# Altium footprint library lib_datalogger.PcbLib: 866 footprints (part 35 of 55)
Each footprint in its own frame and in the unit in brackets; x right, y up, seen from the top. Pads: shape width x height; smd on the part's side, far side on the other; paste and mask are expansions set on the pad; w line width, h text height; cw(c..) or ccw(c..) is an arc to the next point about the centre after c.
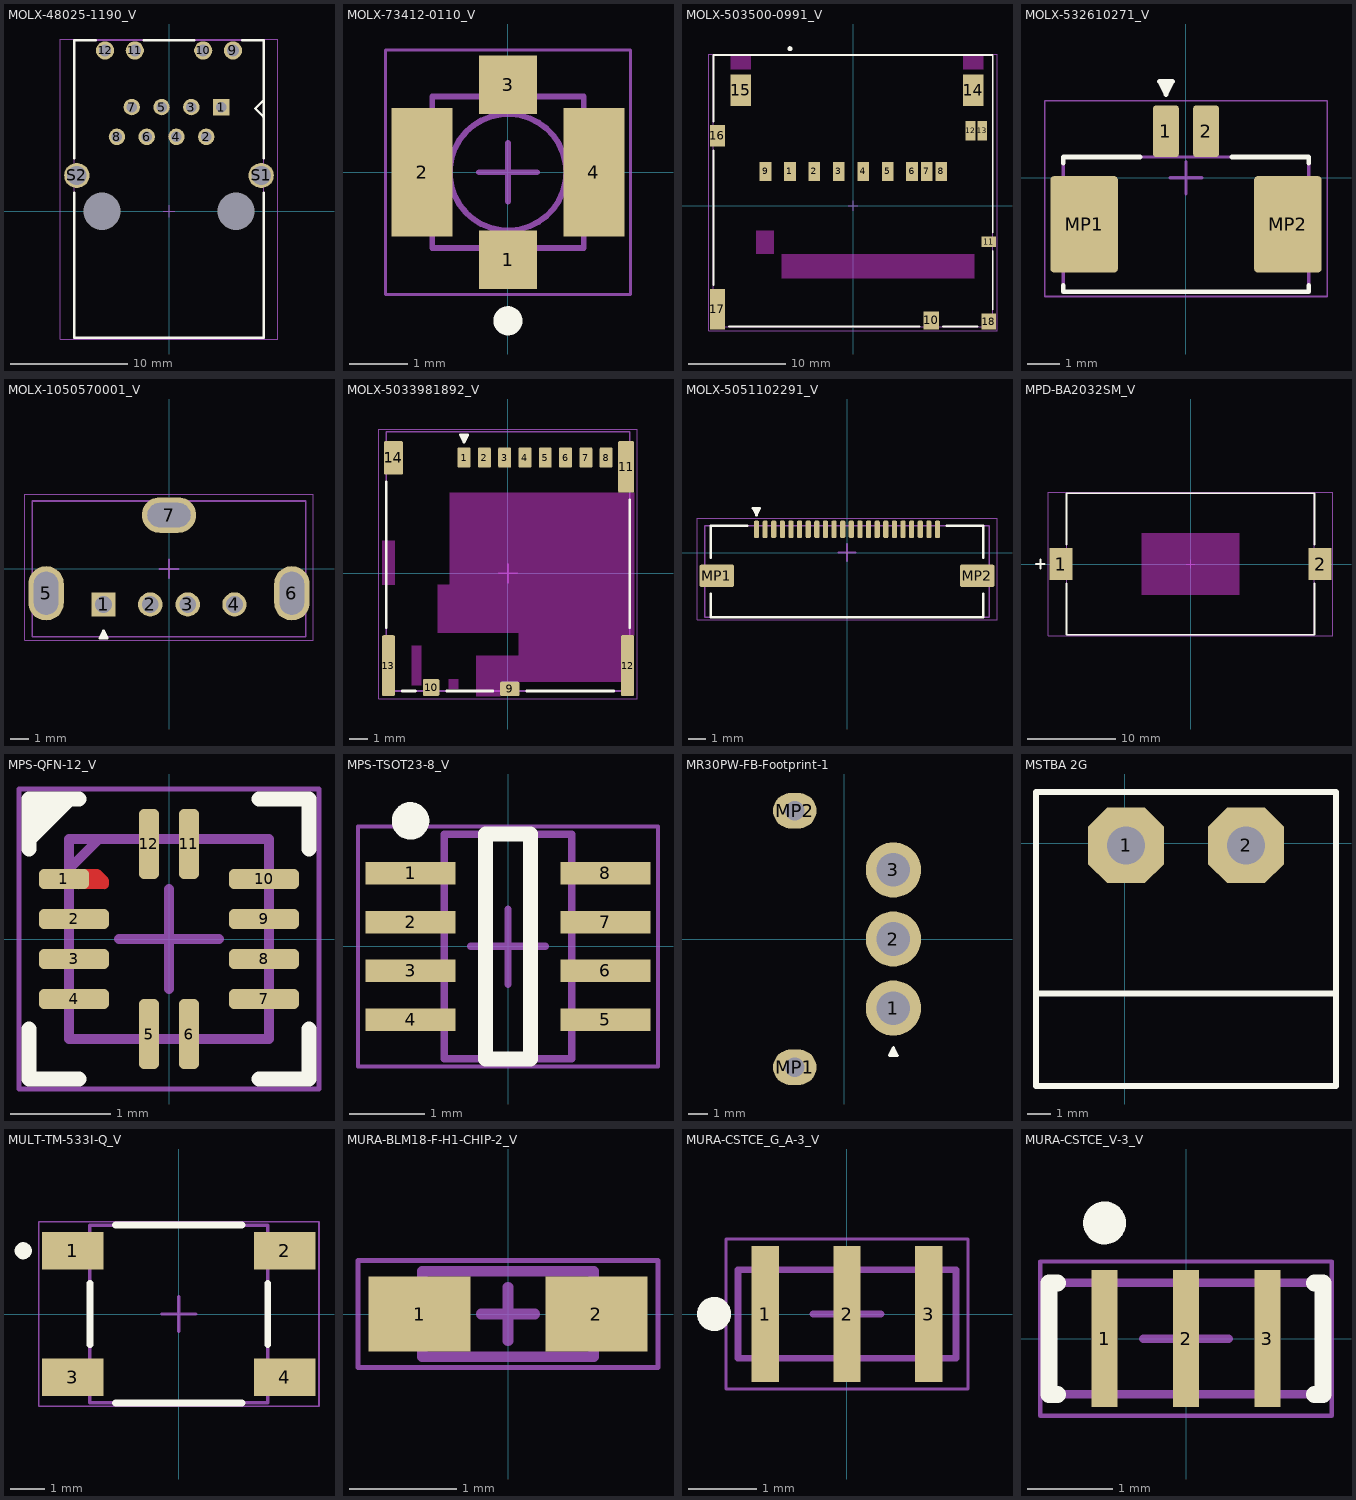
[diagram p34: the footprints below, top view; thin cyan lines are the x and y axes]

## MOLX-48025-1190_V [mm] "Connector, 12-Leads, Body 16.2x25.4mm"
height 14.36
pads (16):
  rect 1.4x1.4 hole 0.89: 1(4.445,8.89)
  round 1.4 hole 0.89: 2(3.175,6.35) 3(1.905,8.89) 4(0.635,6.35) 5(-0.635,8.89) 6(-1.905,6.35) 7(-3.175,8.89) 8(-4.445,6.35)
  round 1.55 hole 1.02: 9(5.46,13.72) 10(2.92,13.72) 11(-2.92,13.72) 12(-5.46,13.72)
  round 0 hole 3.18 unplated: MH1(5.715,0) MH2(-5.715,0)
  round 2.15 hole 1.63: S1(7.87,3.05) S2(-7.87,3.05)
Top Overlay:
  lines w0.2: -8.1,1.593 -8.1,-10.805 8.1,-10.805 8.1,1.593 ; -8.1,4.507 -8.1,14.6 -6.239,14.6 ; -2.141,14.6 2.141,14.6 ; 6.239,14.6 8.1,14.6 8.1,4.507 ; 8.05,8.079 7.366,8.763 8.05,9.447
Mechanical 13:
  lines w0.1: 8.05,8.079 7.366,8.763 8.05,9.447 ; -8.1,-10.805 -8.1,14.6 8.1,14.6 8.1,-10.805 -8.1,-10.805
Mechanical 15:
  lines w0.05: -9.263,-10.905 9.263,-10.905 9.263,14.7 -9.263,14.7 -9.263,-10.905
  lines w0.1: -0.5,0 0.5,0 ; 0,-0.5 0,0.5
3D body "480251190.stp": height 14.35, standoff -3.8, extent -9.163,-10.795 9.163,14.605

## MOLX-73412-0110_V [mm] "MCRF, 4-Leads, Body 2.6x2.6mm"
height 1.3
pads (4):
  rect 1x1 smd: 1(0,-1.5) 3(0,1.5)
  rect 1.05x2.2 smd: 2(-1.475,0) 4(1.475,0)
Top Overlay:
  circle w0.25: c0,-2.55 r0.125
Mechanical 13:
  circle w0.1: c0,0 r1
  lines w0.1: -1.299,-1.299 1.3,-1.299 1.3,1.3 -1.299,1.3 -1.299,-1.299
Mechanical 15:
  lines w0.05: -2.1,-2.1 -2.1,2.1 2.1,2.1 2.1,-2.1 -2.1,-2.1
  lines w0.1: -0.5,0 0.5,0 ; 0,-0.5 0,0.5
3D body: height 0.35, standoff 0, extent -1.299,-1.299 1.3,1.3
3D body: height 1.3, standoff 0.1, extent -1.124,-1.139 1.104,1.09
3D body: height 1.3, standoff 0.1, extent -1.126,-1.141 1.102,1.088
3D body: height 1, standoff 0.1, extent -0.254,-0.254 0.254,0.254

## MOLX-503500-0991_V [mm] "SD Card, 9-Leads, Body 28.6x27.8mm"
height 3.1
pads (18):
  rect 1.2x1.95 smd: 1(-6.457,3.533) 2(-3.957,3.533) 3(-1.457,3.533) 4(1.043,3.533) 5(3.543,3.533) 6(6.043,3.533) 7(7.543,3.533) 8(9.043,3.533) 9(-8.957,3.533)
  rect 1.6x1.87 smd: 10(8.017,-11.727)
  rect 1.5x1.1 smd: 11(13.888,-3.672)
  rect 1x2 smd: 12(12.038,7.698) 13(13.237,7.698)
  rect 2.1x3.2 smd: 14(12.318,11.838) 15(-11.482,11.838)
  rect 1.55x2.2 smd: 16(-13.887,7.158)
  rect 1.55x4.17 smd: 17(-13.887,-10.577)
  rect 1.5x1.65 smd: 18(13.888,-11.837)
Top Layer keep-out:
  rectangle: -7.312,-7.442 12.428,-4.942
  rectangle: -9.907,-4.942 -8.102,-2.542
  rectangle: 11.268,13.938 13.368,15.488
  rectangle: -12.532,13.938 -10.432,15.488
Top Overlay:
  circle w0.25: c-6.457,16.09 r0.127
  lines w0.2: -14.3,-8.092 -14.3,5.658 ; -14.3,8.658 -14.3,15.438 14.3,15.438 14.3,-2.722 ; -12.712,-12.362 6.818,-12.362 ; 9.217,-12.362 12.738,-12.362 ; 14.3,-10.612 14.3,-4.622
Mechanical 13:
  lines w0.1: -14.3,-12.362 -14.3,15.438 14.3,15.438 14.3,-12.362 -14.3,-12.362
Mechanical 15:
  lines w0.05: -14.762,-12.762 14.737,-12.762 14.737,15.538 -14.762,15.538 -14.762,-12.762
  lines w0.1: -0.5,0 0.5,0 ; 0,-0.5 0,0.5
3D body "5035000991.stp": height 2.95, standoff 0, extent -14.3,-12.363 14.3,15.438

## MOLX-532610271_V [mm] "SMD, 2-Leads, Body 7.65x4.2mm, Pitch 1.25mm"
height 3.6
pads (4):
  rrect20% 0.8x1.6 smd: 1(-0.625,1.45) 2(0.625,1.45)
  rrect10% 2.1x3 smd: MP1(-3.175,-1.45) MP2(3.175,-1.45)
Top Overlay:
  region: -0.425,3 -0.825,3 -0.625,2.6
  lines w0.15: -3.825,-3.35 -3.825,-3.55 3.825,-3.55 3.825,-3.35 ; -3.825,0.45 -3.825,0.65 -1.425,0.65 ; 1.425,0.65 3.825,0.65 3.825,0.45 ; -0.825,3 -0.625,2.6 -0.425,3 -0.825,3
Mechanical 13:
  lines w0.1: -3.825,-3.55 3.825,-3.55 3.825,0.65 -3.825,0.65 -3.825,-3.55
Mechanical 15:
  lines w0.05: -4.4,-3.7 4.4,-3.7 4.4,2.4 -4.4,2.4 -4.4,-3.7
  lines w0.1: -0.5,0 0.5,0 ; 0,-0.5 0,0.5
Top Designator:
  text ".Designator" at -1.27,-1.27 h0.6
3D body "532610271.stp": height 3.4, standoff 0, extent -3.825,-3.55 3.825,1.65

## MOLX-1050570001_V [mm] "THD, 4-Leads, Body 14.63x7.25mm"
height 10.5
pads (7):
  rrect10% 1.3x1.3 hole 0.9: 1(-3.5,-1.9)
  round 1.3 hole 0.9: 2(-1,-1.9) 3(1,-1.9) 4(3.5,-1.9)
  oval 1.9x2.9 hole 1.3 slot 2.3 at 90 deg: 5(-6.57,-1.3) 6(6.57,-1.3)
  oval 2.9x1.9 hole 1.3 slot 2.3 at 0 deg: 7(0,2.88)
Top Overlay:
  region: -3.3,-3.7 -3.7,-3.7 -3.5,-3.3
  lines w0.15: -3.7,-3.7 -3.5,-3.3 -3.3,-3.7 -3.7,-3.7
Mechanical 13:
  lines w0.1: -7.315,-3.625 7.315,-3.625 7.315,3.625 -7.315,3.625 -7.315,-3.625
Mechanical 15:
  lines w0.05: -7.7,-3.8 -7.7,4 7.7,4 7.7,-3.8 -7.7,-3.8
  lines w0.1: -0.5,0 0.5,0 ; 0,-0.5 0,0.5
Top Designator:
  text ".Designator" at -1.27,0.889 h0.6
3D body "1050570001.stp": height 10.5, standoff -3.8, extent -7.359,-3.625 7.315,3.659

## MOLX-5033981892_V [mm] "CONN, 8-Leads, Body 14.05x13.2mm, Pitch 1.1mm"
height 1.4
pads (14):
  rrect20% 0.7x1.1 smd: 1(-2.38,6.27) 2(-1.28,6.27) 3(-0.18,6.27) 4(0.92,6.27) 5(2.02,6.27) 6(3.12,6.27) 7(4.22,6.27) 8(5.32,6.27)
  rrect20% 1.05x0.78 smd: 9(0.095,-6.27)
  rrect20% 0.9x0.93 smd: 10(-4.17,-6.195)
  rrect20% 0.86x2.8 smd: 11(6.4,5.77)
  rrect20% 0.7x3.3 smd: 12(6.48,-5.01)
  rrect25% 0.7x3.3 smd: 13(-6.48,-5.01)
  rrect20% 1.04x1.83 smd: 14(-6.21,6.255)
Top Layer keep-out:
  rectangle: -3.22,-6.28 -2.67,-5.73
  rectangle: -5.235,-6.08 -4.685,-3.93
  rectangle: -6.83,-0.63 -6.13,1.77
  region: 6.83,4.37 6.83,-3.36 6.13,-3.36 6.13,-5.88 -0.43,-5.88 -0.43,-6.66 -1.73,-6.66 -1.73,-4.48 0.57,-4.48 0.57,-3.23 -3.82,-3.23 -3.82,-0.63 -3.17,-0.63 -3.17,4.37
Top Overlay:
  region: -2.18,7.5 -2.58,7.5 -2.38,7.1
  lines w0.15: -6.6,-2.96 -6.6,4.94 ; -5.73,-6.38 -5.02,-6.38 ; -3.32,-6.38 -0.83,-6.38 ; 1.02,-6.38 5.73,-6.38 ; 6.6,-2.96 6.6,3.97 ; -2.58,7.5 -2.38,7.1 -2.18,7.5 -2.58,7.5
Mechanical 13:
  lines w0.1: -6.6,-6.38 6.6,-6.38 6.6,7.67 -6.6,7.67 -6.6,-6.38
Mechanical 15:
  lines w0.05: -7,-6.8 -7,7.8 7,7.8 7,-6.8 -7,-6.8
  lines w0.1: -0.5,0 0.5,0 ; 0,-0.5 0,0.5
Top Designator:
  text ".Designator" at -4.318,1.27 h0.6
3D body "5033981892.stp": height 1.28, standoff 0, extent -6.55,-6.38 6.55,7.67

## MOLX-5051102291_V [mm] "SMD, 22-Leads, Body 5.3x16.5mm, Pitch 0.5mm"
height 4.26
pads (24):
  rrect50% 0.3x1 smd: 1(-5.25,1.35) 2(-4.75,1.35) 3(-4.25,1.35) 4(-3.75,1.35) 5(-3.25,1.35) 6(-2.75,1.35) 7(-2.25,1.35) 8(-1.75,1.35) 9(-1.25,1.35) 10(-0.75,1.35) 11(-0.25,1.35) 12(0.25,1.35) 13(0.75,1.35) 14(1.25,1.35) 15(1.75,1.35) 16(2.25,1.35) 17(2.75,1.35) 18(3.25,1.35) 19(3.75,1.35) 20(4.25,1.35) 21(4.75,1.35) 22(5.25,1.35)
  rrect15% 2x1.3 smd: MP1(-7.55,-1.35) MP2(7.55,-1.35)
Top Overlay:
  region: -5.05,2.575 -5.45,2.575 -5.25,2.175
  lines w0.15: -7.9,-2.4 -7.9,-3.75 7.9,-3.75 7.9,-2.4 ; -7.9,-0.3 -7.9,1.55 -5.8,1.55 ; 5.8,1.55 7.9,1.55 7.9,-0.3 ; -5.45,2.575 -5.25,2.175 -5.05,2.575 -5.45,2.575
Mechanical 13:
  lines w0.1: -8.25,-3.75 -8.25,1.55 8.25,1.55 8.25,-3.75 -8.25,-3.75
Mechanical 15:
  lines w0.05: -8.7,-3.9 -8.7,2 8.7,2 8.7,-3.9 -8.7,-3.9
  lines w0.1: -0.5,0 0.5,0 ; 0,-0.5 0,0.5
Top Designator:
  text ".Designator" at -1.397,-1.397 h0.6
3D body "5051102291.stp": height 1.9, standoff 0, extent -8.25,-3.75 8.25,1.55

## MPD-BA2032SM_V [mm] "Coin Cell Holder, 2-Leads, Body 28x16mm"
height 6.7
pads (2):
  rect 2.6x3.56 smd: 1(-14.65,0) 2(14.65,0)
Top Overlay:
  lines w0.2: -17.45,0 -16.45,0 ; -16.95,-0.5 -16.95,0.5 ; -14,-2.18 -14,-8 14,-8 14,-2.18 ; -14,2.18 -14,8 14,8 14,2.18
Keep-Out Layer:
  region: -5.5,-3.5 5.5,-3.5 5.5,3.5 -5.5,3.5
Mechanical 13:
  lines w0.1: -14,-8 -14,8 14,8 ; -13.97,-8.001 13.999,-8.001 ; 13.999,8 13.999,-8.001 ; 14,-8 13.999,-8.001
Mechanical 15:
  lines w0.05: -16.05,-8.1 -16.05,8.1 16.05,8.1 16.05,-8.1 -16.05,-8.1
  lines w0.1: -0.5,0 0.5,0 ; 0,-0.5 0,0.5
3D body: height 6.7, standoff 6, extent -11.43,-8.001 -5.207,-3.81
3D body: height 6.7, standoff 6, extent -11.43,3.809 -5.207,8
3D body: height 6.7, standoff 0, extent -14,-8.001 -11.43,8
3D body: height 6.7, standoff 6, extent -7.849,-1.499 -4.851,1.499
3D body: height 6.7, standoff 6, extent -11.43,-1.193 -7.206,1.22
3D body: height 6.7, standoff 0, extent 12.699,-8.001 13.999,8
3D body: height 6.7, standoff 6, extent 10.16,-8.001 12.701,-4.447
3D body: height 6.7, standoff 6, extent 11.176,-3.175 12.7,2.54
3D body: height 1, standoff 0, extent -11.43,-8.001 12.701,8
3D body: height 2.5, standoff 0, extent -11.43,6.35 12.7,8
3D body: height 2.5, standoff 0, extent -11.429,-8.001 12.701,-6.351
3D body: height 2.5, standoff 0, extent -3.175,-3.428 6.35,-2.539
3D body: height 2.5, standoff 0, extent -3.175,2.033 6.35,2.922
3D body: height 6.7, standoff 6, extent 10.16,4.445 12.7,7.999

## MPS-QFN-12_V [mm] "QFN, 12-Leads, Body 2x2mm, Pitch 0.4mm"
height 1
pads (12):
  rrect50% 0.5x0.2 smd: 1(-1.05,0.6)
  rrect50% 0.7x0.2 smd: 2(-0.95,0.2) 3(-0.95,-0.2) 4(-0.95,-0.6) 7(0.95,-0.6) 8(0.95,-0.2) 9(0.95,0.2) 10(0.95,0.6)
  rrect50% 0.2x0.7 smd: 5(-0.2,-0.95) 6(0.2,-0.95) 11(0.2,0.95) 12(-0.2,0.95)
Top Layer:
  region: -0.9,0.5 -0.65,0.5 -0.64,0.5 -0.622,0.508 -0.608,0.522 -0.6,0.54 -0.6,0.55 -0.6,0.575 -0.6,0.581 -0.602,0.593 -0.607,0.604 -0.613,0.613 -0.618,0.618 -0.682,0.682 -0.687,0.687 -0.696,0.693 -0.707,0.698 -0.719,0.7 -0.725,0.7 -0.9,0.7
Top Overlay:
  region: -1.4,1.4 -1.4,1 -1,1.4
  lines w0.15: -1.4,-0.9 -1.4,-1.4 -0.9,-1.4 ; -1.4,0.9 -1.4,1 ; -0.9,1.4 -1,1.4 ; 0.9,-1.4 1.4,-1.4 1.4,-0.9 ; 0.9,1.4 1.4,1.4 1.4,0.9 ; -1.4,1 -1.4,1.4 -1,1.4 ; -1.4,1 -1,1.4
Mechanical 13:
  lines w0.1: -1,0.7 -0.7,1 ; -1,-1 1,-1 1,1 -1,1 -1,-1
Mechanical 15:
  lines w0.05: -1.5,-1.5 1.5,-1.5 1.5,1.5 -1.5,1.5 -1.5,-1.5
  lines w0.1: -0.5,0 0.5,0 ; 0,-0.5 0,0.5
Top Designator:
  text ".Designator" at -1.27,-0.127 h0.6
3D body: height 1.01, standoff 0, extent -0.799,0.401 -0.4,0.8
3D body: height 1, standoff 0, extent -1,-1 1,1

## MPS-TSOT23-8_V [mm] "SOP, 8-Leads, Body 3x1.7mm, Pitch 0.65mm"
height 1
pads (8):
  rect 1.2x0.3 smd: 1(-1.3,0.975) 2(-1.3,0.325) 3(-1.3,-0.325) 4(-1.3,-0.975) 5(1.3,-0.975) 6(1.3,-0.325) 7(1.3,0.325) 8(1.3,0.975)
Top Overlay:
  circle w0.25: c-1.3,1.675 r0.125
  lines w0.2: -0.3,-1.5 -0.3,1.5 0.3,1.5 0.3,-1.5 -0.3,-1.5
Mechanical 13:
  lines w0.1: -0.85,-1.5 -0.85,1.5 0.85,1.5 0.85,-1.5 -0.85,-1.5
Mechanical 15:
  lines w0.05: -2,-1.6 -2,1.6 2,1.6 2,-1.6 -2,-1.6
  lines w0.1: -0.5,0 0.5,0 ; 0,-0.5 0,0.5
3D body "TSOP65P280X100-8L.step": height 1, standoff 0, extent -1.4,-1.5 1.4,1.5

## MR30PW-FB-Footprint-1 [mm]
pads (5):
  round 2.8 hole 1.7: 1(2.5,-3.5) 2(2.5,0) 3(2.5,3.5)
  oval 2.2x1.8 hole 1: MP1(-2.5,-6.5) MP2(-2.5,6.5)
Top Overlay:
  region: 2.3,-5.9 2.7,-5.9 2.5,-5.5
  lines w0.15: 2.3,-5.9 2.5,-5.5 2.7,-5.9 2.3,-5.9
Top Designator:
  text ".Designator" at -5.461,0.127 h0.6
3D body "MR30PW-FB.STEP": height 5.3, standoff -2, extent -11.55,-7.65 3.3,7.65

## MSTBA 2G [mil]
pads (2):
  oct 126x126 hole 63: 1(2,-4) 2(202,-4)
Top Overlay:
  lines w10: -148,-251.15 347.87,-251.15 ; -148,-405 352,-405 352,85 -148,85 -148,-405
3D body "1757242.stp": height 338.58, standoff -137.8, extent -137.37,-397.53 341.37,75

## MULT-TM-533I-Q_V [mm] "SMD, 4-Leads, Body 5.2x5.2mm"
height 1.69
pads (4):
  rect 1.8x1.1 smd: 1(-3.1,1.85) 2(3.1,1.85) 3(-3.1,-1.85) 4(3.1,-1.85)
Top Overlay:
  circle w0.25: c-4.55,1.85 r0.125
  lines w0.2: -2.6,-0.9 -2.6,0.9 ; -1.85,-2.6 1.85,-2.6 ; -1.85,2.6 1.85,2.6 ; 2.6,-0.9 2.6,0.9
Mechanical 13:
  lines w0.1: -2.6,-2.6 2.6,-2.6 2.6,2.6 -2.6,2.6 -2.6,-2.6
Mechanical 15:
  lines w0.05: -4.1,-2.7 -4.1,2.7 4.1,2.7 4.1,-2.7 -4.1,-2.7
  lines w0.1: -0.5,0 0.5,0 ; 0,-0.5 0,0.5
3D body: height 1.69, standoff 0, extent -2.6,-2.6 2.6,2.6
3D body: height 1.74, standoff 0.05, extent -0.992,-0.998 1,0.998

## MURA-BLM18-F-H1-CHIP-2_V [mm] "Chip Ferrite Bead, 2-Leads, Body 1.6x0.8mm, Height 0.95mm, Flow"
height 0.95
pads (2):
  rect 0.95x0.7 smd: 1(-0.825,0) 2(0.825,0)
Top Assembly:
  text "Land Pattern Adapted for Flow Soldering" at -1,0.6 h0.05
Mechanical 13:
  lines w0.1: -0.8,-0.4 0.8,-0.4 0.8,0.4 -0.8,0.4 -0.8,-0.4
Mechanical 15:
  lines w0.05: -1.4,-0.5 -1.4,0.5 1.4,0.5 1.4,-0.5 -1.4,-0.5
  lines w0.1: -0.25,0 0.25,0 ; 0,-0.25 0,0.25
3D body "RESC1608X09L.step": height 0.95, standoff 0, extent -0.875,-0.475 0.875,0.475

## MURA-CSTCE_G_A-3_V [mm] "SMD, 3-Leads, Body 3.2x1.3mm, Pitch 1.2mm"
height 0.8
pads (3):
  rect 0.4x2 smd: 1(-1.2,0) 2(0,0) 3(1.2,0)
Top Overlay:
  circle w0.25: c-1.95,0 r0.125
Mechanical 13:
  lines w0.1: -1.6,-0.65 1.6,-0.65 1.6,0.65 -1.6,0.65 -1.6,-0.65
Mechanical 15:
  lines w0.05: -1.775,-1.1 1.775,-1.1 1.775,1.1 -1.775,1.1 -1.775,-1.1
  lines w0.1: -0.5,0 0.5,0 ; 0,-0.5 0,0.5
3D body "SW3dPS-CSTCE.STEP": height 0.7, standoff 0, extent -1.6,-0.65 1.6,0.65

## MURA-CSTCE_V-3_V [mm] "SMD, 3-Leads, Body 3.2x1.3mm, Pitch 0.95mm"
height 1
pads (3):
  rect 0.3x1.6 smd: 1(-0.95,0) 2(0,0) 3(0.95,0)
Top Overlay:
  circle w0.25: c-0.95,1.35 r0.125
  lines w0.2: -1.5,-0.65 -1.6,-0.65 -1.6,0.65 -1.5,0.65 ; 1.5,-0.65 1.6,-0.65 1.6,0.65 1.5,0.65
Mechanical 13:
  lines w0.1: -1.6,-0.65 -1.6,0.65 1.6,0.65 1.6,-0.65 -1.6,-0.65
Mechanical 15:
  lines w0.05: -1.7,-0.9 1.7,-0.9 1.7,0.9 -1.7,0.9 -1.7,-0.9
  lines w0.1: -0.5,0 0.5,0 ; 0,-0.5 0,0.5
3D body "SW3dPS-CSTCE_V-1.STEP": height 1.02, standoff -0.09, extent -1.6,-0.65 1.6,0.65